# Altium footprint library Metric_SMD.PcbLib: 185 footprints (part 6 of 12)
Each footprint in its own frame and in the unit in brackets; x right, y up, seen from the top. Pads: shape width x height; smd on the part's side, far side on the other; paste and mask are expansions set on the pad; w line width, h text height; cw(c..) or ccw(c..) is an arc to the next point about the centre after c.
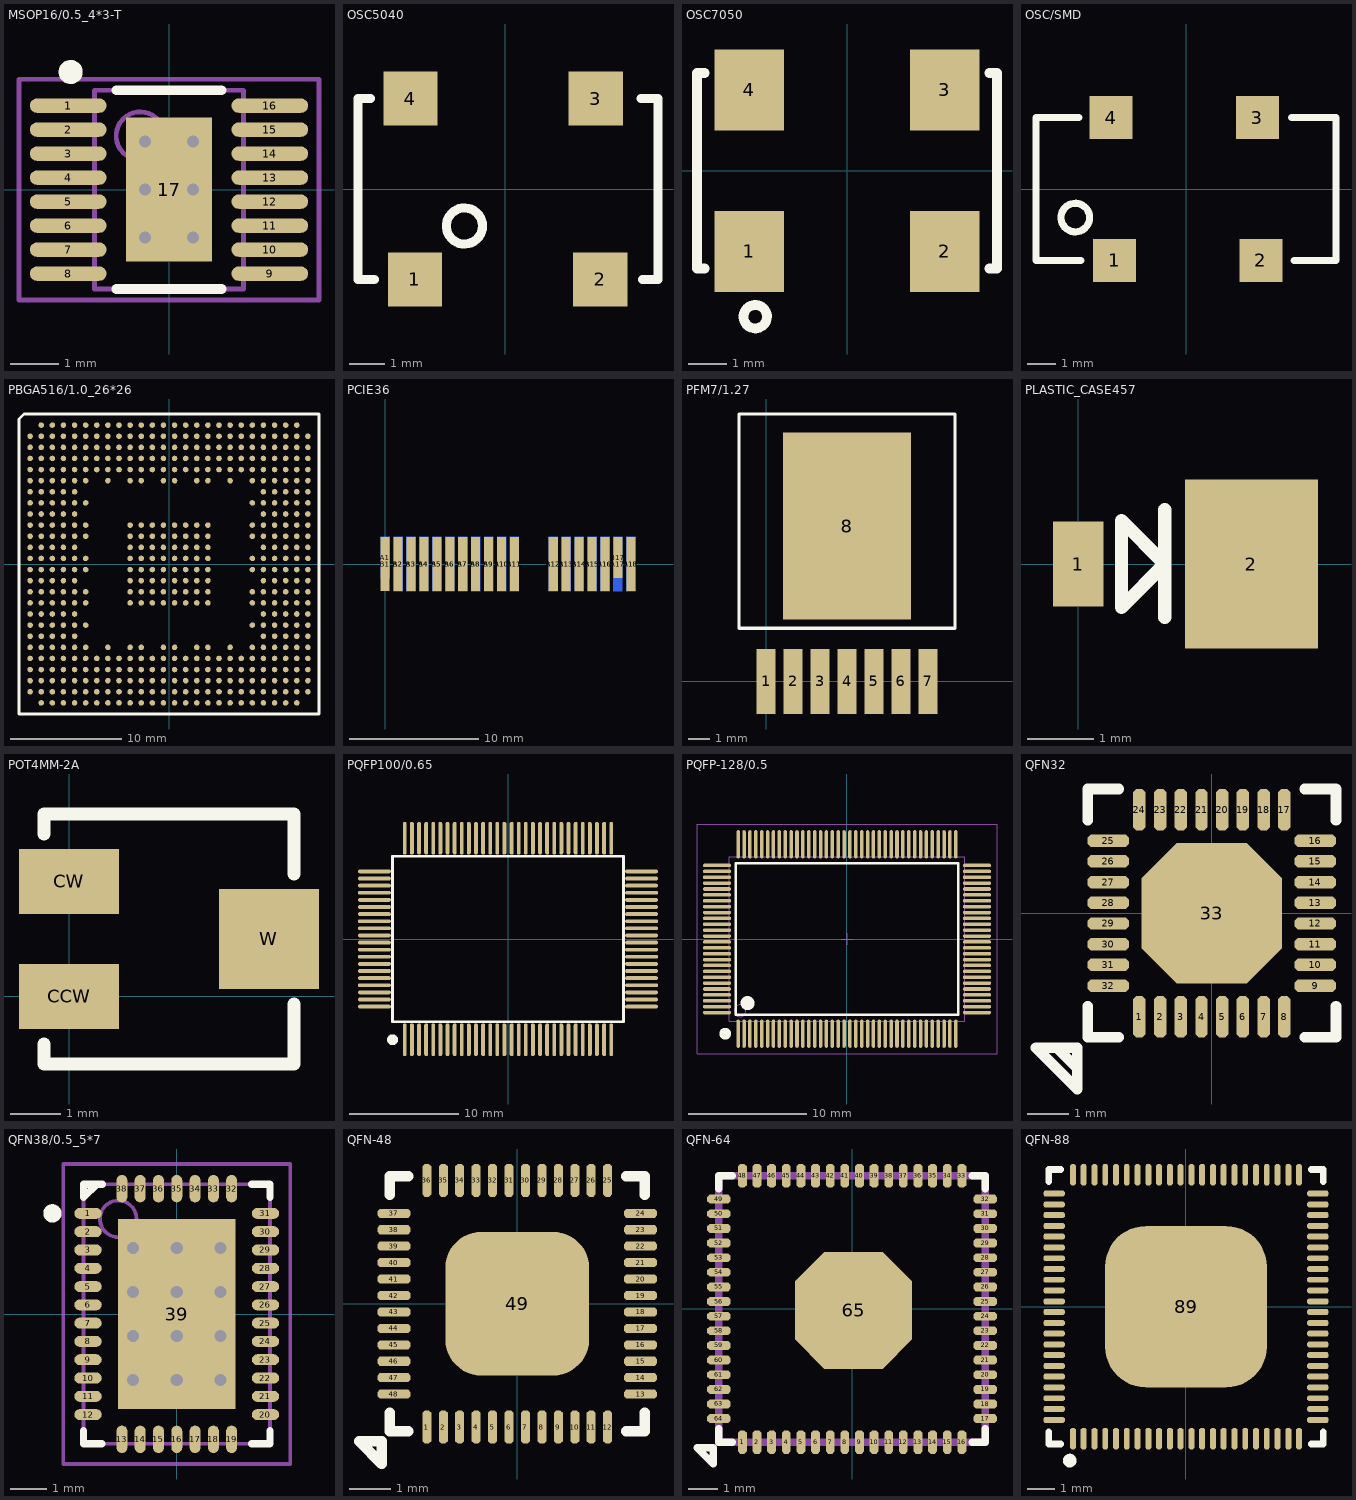
[diagram p5: the footprints below, top view; thin cyan lines are the x and y axes]

## MSOP16/0.5_4*3-T [mm] "MSOP, 16-Leads,  Exposed Die Pad,Body 4.1x3.1mm (max), Pitch 0.50mm, IPC Medium Density"
height 1.1
pads (17):
  oval 1.6x0.3 smd: 1(-2.1,1.75) 2(-2.1,1.25) 3(-2.1,0.75) 4(-2.1,0.25) 5(-2.1,-0.25) 6(-2.1,-0.75) 7(-2.1,-1.25) 8(-2.1,-1.75) 9(2.1,-1.75) 10(2.1,-1.25) 11(2.1,-0.75) 12(2.1,-0.25) 13(2.1,0.25) 14(2.1,0.75) 15(2.1,1.25) 16(2.1,1.75)
  rect 1.8x3 smd: 17(0,0)
via 0.5,-1 diameter 0.559 hole 0.254
via -0.5,-1 diameter 0.559 hole 0.254
via 0.5,0 diameter 0.559 hole 0.254
via -0.5,0 diameter 0.559 hole 0.254
via 0.5,1 diameter 0.559 hole 0.254
via -0.5,1 diameter 0.559 hole 0.254
Top Overlay:
  circle w0.25: c-2.05,2.45 r0.125
  lines w0.2: -1.1,-2.07 1.1,-2.07 ; -1.1,2.07 1.1,2.07
Mechanical 13:
  circle w0.1: c-0.6,1.12 r0.5
  lines w0.1: -1.55,-2.07 1.55,-2.07 1.55,2.07 -1.55,2.07 -1.55,-2.07
Mechanical 15:
  lines w0.1: -0.5,0 0.5,0 ; 0,-0.5 0,0.5 ; -3.125,-2.3 3.125,-2.3 3.125,2.3 -3.125,2.3 -3.125,-2.3
3D body: height 1.1, standoff 0.05, extent -1.55,-2.07 1.55,2.07

## OSC5040 [mil] "晶振SMD 200 x 160mil"
height 60
pads (4):
  rect 60x60 smd: 1(-100,-100) 2(105,-100) 3(100,100) 4(-105,100)
Top Overlay:
  circle w10: c-45.2,-40.94 r20
  lines w10: -149,100 -163,100 -163,-100 -145,-100 ; 150,100 169,100 169,-100 152,-100
3D body: height 78.74, standoff 7.87, extent -151.18,-100 151.97,100.79
3D body: height 86.61, standoff 7.87, extent -119.69,-82.28 112.6,79.13

## OSC7050 [mm] "晶振SMD 7.0x5.0mm"
height 1.524
pads (4):
  rect 1.8x2.1 smd: 1(-2.54,-2.1) 2(2.54,-2.1) 3(2.54,2.1) 4(-2.54,2.1)
Top Overlay:
  lines w0.254: -3.7,-2.54 -3.9,-2.54 -3.9,2.54 -3.7,2.54 ; -2.083,-3.759 ccw(c-2.385,-3.796) -2.081,-3.796 ; 3.7,-2.54 3.9,-2.54 3.9,2.54 3.7,2.54
3D body "User Library-ASV-Oscil.STEP": height 1.8, standoff 0, extent -3.515,-2.6 3.485,2.48

## OSC/SMD [mil]
height 118.11
pads (4):
  rect 60x60 smd: 1(-100,-100) 2(105,-100) 3(100,100) 4(-105,100)
Top Overlay:
  circle w10: c-155,-40 r20
  lines w10: -150,100 -210,100 -210,-100 -147,-100 ; 148,100 210,100 210,-100 151,-100

## PBGA516/1.0_26*26 [mm]
height 2.25
pads (516):
  round 0.5 smd: A2(-11.5,12.5) A3(-10.5,12.5) A4(-9.5,12.5) A5(-8.5,12.5) A6(-7.5,12.5) A7(-6.5,12.5) A8(-5.5,12.5) A9(-4.5,12.5) A10(-3.5,12.5) A11(-2.5,12.5) A12(-1.5,12.5) A13(-0.5,12.5) A14(0.5,12.5) A15(1.5,12.5) A16(2.5,12.5) A17(3.5,12.5) A18(4.5,12.5) A19(5.5,12.5) A20(6.5,12.5) A21(7.5,12.5) A22(8.5,12.5) A23(9.5,12.5) A24(10.5,12.5) A25(11.5,12.5) AA1(-12.5,-7.5) AA2(-11.5,-7.5) AA3(-10.5,-7.5) AA4(-9.5,-7.5) AA5(-8.5,-7.5) AA6(-7.5,-7.5) AA8(-5.5,-7.5) AA10(-3.5,-7.5) AA11(-2.5,-7.5) AA13(-0.5,-7.5) AA14(0.5,-7.5) AA16(2.5,-7.5) AA17(3.5,-7.5) AA19(5.5,-7.5) AA21(7.5,-7.5) AA22(8.5,-7.5) AA23(9.5,-7.5) AA24(10.5,-7.5) AA25(11.5,-7.5) AA26(12.5,-7.5) AB1(-12.5,-8.5) AB2(-11.5,-8.5) AB3(-10.5,-8.5) AB4(-9.5,-8.5) AB5(-8.5,-8.5) AB6(-7.5,-8.5) AB7(-6.5,-8.5) AB8(-5.5,-8.5) AB9(-4.5,-8.5) AB10(-3.5,-8.5) AB11(-2.5,-8.5) AB12(-1.5,-8.5) AB13(-0.5,-8.5) AB14(0.5,-8.5) AB15(1.5,-8.5) AB16(2.5,-8.5) AB17(3.5,-8.5) AB18(4.5,-8.5) AB19(5.5,-8.5) AB20(6.5,-8.5) AB21(7.5,-8.5) AB22(8.5,-8.5) AB23(9.5,-8.5) AB24(10.5,-8.5) AB25(11.5,-8.5) AB26(12.5,-8.5) AC1(-12.5,-9.5) AC2(-11.5,-9.5) AC3(-10.5,-9.5) AC4(-9.5,-9.5) AC5(-8.5,-9.5) AC6(-7.5,-9.5) AC7(-6.5,-9.5) AC8(-5.5,-9.5) AC9(-4.5,-9.5) AC10(-3.5,-9.5) AC11(-2.5,-9.5) AC12(-1.5,-9.5) AC13(-0.5,-9.5) AC14(0.5,-9.5) AC15(1.5,-9.5) AC16(2.5,-9.5) AC17(3.5,-9.5) AC18(4.5,-9.5) AC19(5.5,-9.5) AC20(6.5,-9.5) AC21(7.5,-9.5) AC22(8.5,-9.5) AC23(9.5,-9.5) AC24(10.5,-9.5) AC25(11.5,-9.5) AC26(12.5,-9.5) AD1(-12.5,-10.5) AD2(-11.5,-10.5) AD3(-10.5,-10.5) AD4(-9.5,-10.5) AD5(-8.5,-10.5) AD6(-7.5,-10.5) AD7(-6.5,-10.5) AD8(-5.5,-10.5) AD9(-4.5,-10.5) AD10(-3.5,-10.5) AD11(-2.5,-10.5) AD12(-1.5,-10.5) AD13(-0.5,-10.5) AD14(0.5,-10.5) AD15(1.5,-10.5) AD16(2.5,-10.5) AD17(3.5,-10.5) AD18(4.5,-10.5) AD19(5.5,-10.5) AD20(6.5,-10.5) AD21(7.5,-10.5) AD22(8.5,-10.5) AD23(9.5,-10.5) AD24(10.5,-10.5) AD25(11.5,-10.5) AD26(12.5,-10.5) AE1(-12.5,-11.5) AE2(-11.5,-11.5) AE3(-10.5,-11.5) AE4(-9.5,-11.5) AE5(-8.5,-11.5) AE6(-7.5,-11.5) AE7(-6.5,-11.5) AE8(-5.5,-11.5) AE9(-4.5,-11.5) AE10(-3.5,-11.5) AE11(-2.5,-11.5) AE12(-1.5,-11.5) AE13(-0.5,-11.5) AE14(0.5,-11.5) AE15(1.5,-11.5) AE16(2.5,-11.5) AE17(3.5,-11.5) AE18(4.5,-11.5) AE19(5.5,-11.5) AE20(6.5,-11.5) AE21(7.5,-11.5) AE22(8.5,-11.5) AE23(9.5,-11.5) AE24(10.5,-11.5) AE25(11.5,-11.5) AE26(12.5,-11.5) AF2(-11.5,-12.5) AF3(-10.5,-12.5) AF4(-9.5,-12.5) AF5(-8.5,-12.5) AF6(-7.5,-12.5) AF7(-6.5,-12.5) AF8(-5.5,-12.5) AF9(-4.5,-12.5) AF10(-3.5,-12.5) AF11(-2.5,-12.5) AF12(-1.5,-12.5) AF13(-0.5,-12.5) AF14(0.5,-12.5) AF15(1.5,-12.5) AF16(2.5,-12.5) AF17(3.5,-12.5) AF18(4.5,-12.5) AF19(5.5,-12.5) AF20(6.5,-12.5) AF21(7.5,-12.5) AF22(8.5,-12.5) AF23(9.5,-12.5) AF24(10.5,-12.5) AF25(11.5,-12.5) B1(-12.5,11.5) B2(-11.5,11.5) B3(-10.5,11.5) B4(-9.5,11.5) B5(-8.5,11.5) B6(-7.5,11.5) B7(-6.5,11.5) B8(-5.5,11.5) B9(-4.5,11.5) B10(-3.5,11.5) B11(-2.5,11.5) B12(-1.5,11.5) B13(-0.5,11.5) B14(0.5,11.5) B15(1.5,11.5) B16(2.5,11.5) B17(3.5,11.5) B18(4.5,11.5) B19(5.5,11.5) B20(6.5,11.5) B21(7.5,11.5) B22(8.5,11.5) B23(9.5,11.5) B24(10.5,11.5) B25(11.5,11.5) B26(12.5,11.5) C1(-12.5,10.5) C2(-11.5,10.5) C3(-10.5,10.5) C4(-9.5,10.5) C5(-8.5,10.5) C6(-7.5,10.5) C7(-6.5,10.5) C8(-5.5,10.5) C9(-4.5,10.5) C10(-3.5,10.5) C11(-2.5,10.5) C12(-1.5,10.5) C13(-0.5,10.5) C14(0.5,10.5) C15(1.5,10.5) C16(2.5,10.5) C17(3.5,10.5) C18(4.5,10.5) C19(5.5,10.5) C20(6.5,10.5) C21(7.5,10.5) C22(8.5,10.5) C23(9.5,10.5) C24(10.5,10.5) C25(11.5,10.5) C26(12.5,10.5) D1(-12.5,9.5) D2(-11.5,9.5) D3(-10.5,9.5) D4(-9.5,9.5) D5(-8.5,9.5) D6(-7.5,9.5) D7(-6.5,9.5) D8(-5.5,9.5) D9(-4.5,9.5) D10(-3.5,9.5) D11(-2.5,9.5) D12(-1.5,9.5) D13(-0.5,9.5) D14(0.5,9.5) D15(1.5,9.5) D16(2.5,9.5) D17(3.5,9.5) D18(4.5,9.5) D19(5.5,9.5) D20(6.5,9.5) D21(7.5,9.5) D22(8.5,9.5) D23(9.5,9.5) D24(10.5,9.5) D25(11.5,9.5) D26(12.5,9.5) E1(-12.5,8.5) E2(-11.5,8.5) E3(-10.5,8.5) E4(-9.5,8.5) E5(-8.5,8.5) E6(-7.5,8.5) E7(-6.5,8.5) E8(-5.5,8.5) E9(-4.5,8.5) E10(-3.5,8.5) E11(-2.5,8.5) E12(-1.5,8.5) E13(-0.5,8.5) E14(0.5,8.5) E15(1.5,8.5) E16(2.5,8.5) E17(3.5,8.5) E18(4.5,8.5) E19(5.5,8.5) E20(6.5,8.5) E21(7.5,8.5) E22(8.5,8.5) E23(9.5,8.5) E24(10.5,8.5) E25(11.5,8.5) E26(12.5,8.5) F1(-12.5,7.5) F2(-11.5,7.5) F3(-10.5,7.5) F4(-9.5,7.5) F5(-8.5,7.5) F6(-7.5,7.5) F8(-5.5,7.5) F10(-3.5,7.5) F11(-2.5,7.5) F13(-0.5,7.5) F14(0.5,7.5) F16(2.5,7.5) F17(3.5,7.5) F19(5.5,7.5) F21(7.5,7.5) F22(8.5,7.5) F23(9.5,7.5) F24(10.5,7.5) F25(11.5,7.5) F26(12.5,7.5) G1(-12.5,6.5) G2(-11.5,6.5) G3(-10.5,6.5) G4(-9.5,6.5) G5(-8.5,6.5) G22(8.5,6.5) G23(9.5,6.5) G24(10.5,6.5) G25(11.5,6.5) G26(12.5,6.5) H1(-12.5,5.5) H2(-11.5,5.5) H3(-10.5,5.5) H4(-9.5,5.5) H5(-8.5,5.5) H6(-7.5,5.5) H21(7.5,5.5) H22(8.5,5.5) H23(9.5,5.5) H24(10.5,5.5) H25(11.5,5.5) H26(12.5,5.5) J1(-12.5,4.5) J2(-11.5,4.5) J3(-10.5,4.5) J4(-9.5,4.5) J5(-8.5,4.5) J22(8.5,4.5) J23(9.5,4.5) J24(10.5,4.5) J25(11.5,4.5) J26(12.5,4.5) K1(-12.5,3.5) K2(-11.5,3.5) K3(-10.5,3.5) K4(-9.5,3.5) K5(-8.5,3.5) K6(-7.5,3.5) K10(-3.5,3.5) K11(-2.5,3.5) K12(-1.5,3.5) K13(-0.5,3.5) K14(0.5,3.5) K15(1.5,3.5) K16(2.5,3.5) K17(3.5,3.5) K21(7.5,3.5) K22(8.5,3.5) K23(9.5,3.5) K24(10.5,3.5) K25(11.5,3.5) K26(12.5,3.5) L1(-12.5,2.5) L2(-11.5,2.5) L3(-10.5,2.5) L4(-9.5,2.5) L5(-8.5,2.5) L6(-7.5,2.5) L10(-3.5,2.5) L11(-2.5,2.5) L12(-1.5,2.5) L13(-0.5,2.5) L14(0.5,2.5) L15(1.5,2.5) L16(2.5,2.5) L17(3.5,2.5) L21(7.5,2.5) L22(8.5,2.5) L23(9.5,2.5) L24(10.5,2.5) L25(11.5,2.5) L26(12.5,2.5) M1(-12.5,1.5) M2(-11.5,1.5) M3(-10.5,1.5) M4(-9.5,1.5) M5(-8.5,1.5) M10(-3.5,1.5) M11(-2.5,1.5) M12(-1.5,1.5) M13(-0.5,1.5) M14(0.5,1.5) M15(1.5,1.5) M16(2.5,1.5) M17(3.5,1.5) M22(8.5,1.5) M23(9.5,1.5) M24(10.5,1.5) M25(11.5,1.5) M26(12.5,1.5) N1(-12.5,0.5) N2(-11.5,0.5) N3(-10.5,0.5) N4(-9.5,0.5) N5(-8.5,0.5) N6(-7.5,0.5) N10(-3.5,0.5) N11(-2.5,0.5) N12(-1.5,0.5) N13(-0.5,0.5) N14(0.5,0.5) N15(1.5,0.5) N16(2.5,0.5) N17(3.5,0.5) N21(7.5,0.5) N22(8.5,0.5) N23(9.5,0.5) N24(10.5,0.5) N25(11.5,0.5) N26(12.5,0.5) P1(-12.5,-0.5) P2(-11.5,-0.5) P3(-10.5,-0.5) P4(-9.5,-0.5) P5(-8.5,-0.5) P6(-7.5,-0.5) P10(-3.5,-0.5) P11(-2.5,-0.5) P12(-1.5,-0.5) P13(-0.5,-0.5) P14(0.5,-0.5) P15(1.5,-0.5) P16(2.5,-0.5) P17(3.5,-0.5) P21(7.5,-0.5) P22(8.5,-0.5) P23(9.5,-0.5) P24(10.5,-0.5) P25(11.5,-0.5) P26(12.5,-0.5) R1(-12.5,-1.5) R2(-11.5,-1.5) R3(-10.5,-1.5) R4(-9.5,-1.5) R5(-8.5,-1.5) R10(-3.5,-1.5) R11(-2.5,-1.5) R12(-1.5,-1.5) R13(-0.5,-1.5) R14(0.5,-1.5) R15(1.5,-1.5) R16(2.5,-1.5) R17(3.5,-1.5) R22(8.5,-1.5) R23(9.5,-1.5) R24(10.5,-1.5) R25(11.5,-1.5) R26(12.5,-1.5) T1(-12.5,-2.5) T2(-11.5,-2.5) T3(-10.5,-2.5) T4(-9.5,-2.5) T5(-8.5,-2.5) T6(-7.5,-2.5) T10(-3.5,-2.5) T11(-2.5,-2.5) T12(-1.5,-2.5) T13(-0.5,-2.5) T14(0.5,-2.5) T15(1.5,-2.5) T16(2.5,-2.5) T17(3.5,-2.5) T21(7.5,-2.5) T22(8.5,-2.5) T23(9.5,-2.5) T24(10.5,-2.5) T25(11.5,-2.5) T26(12.5,-2.5) U1(-12.5,-3.5) U2(-11.5,-3.5) U3(-10.5,-3.5) U4(-9.5,-3.5) U5(-8.5,-3.5) U6(-7.5,-3.5) U10(-3.5,-3.5) U11(-2.5,-3.5) U12(-1.5,-3.5) U13(-0.5,-3.5) U14(0.5,-3.5) U15(1.5,-3.5) U16(2.5,-3.5) U17(3.5,-3.5) U21(7.5,-3.5) U22(8.5,-3.5) U23(9.5,-3.5) U24(10.5,-3.5) U25(11.5,-3.5) U26(12.5,-3.5) V1(-12.5,-4.5) V2(-11.5,-4.5) V3(-10.5,-4.5) V4(-9.5,-4.5) V5(-8.5,-4.5) V22(8.5,-4.5) V23(9.5,-4.5) V24(10.5,-4.5) V25(11.5,-4.5) V26(12.5,-4.5) W1(-12.5,-5.5) W2(-11.5,-5.5) W3(-10.5,-5.5) W4(-9.5,-5.5) W5(-8.5,-5.5) W6(-7.5,-5.5) W21(7.5,-5.5) W22(8.5,-5.5) W23(9.5,-5.5) W24(10.5,-5.5) W25(11.5,-5.5) W26(12.5,-5.5) Y1(-12.5,-6.5) Y2(-11.5,-6.5) Y3(-10.5,-6.5) Y4(-9.5,-6.5) Y5(-8.5,-6.5) Y22(8.5,-6.5) Y23(9.5,-6.5) Y24(10.5,-6.5) Y25(11.5,-6.5) Y26(12.5,-6.5)
Top Overlay:
  lines w0.254: -13.5,-13.5 13.5,-13.5 13.5,13.5 -13.05,13.5 -13.5,13.05 -13.5,-13.5

## PCIE36 [mm] "PCIe1X金手指插头"
pads (36):
  rect 0.7x3.2 smd far side: A1(0,0.5)
  rect 0.7x4.2 smd far side: A2(1,0) A3(2,0) A4(3,0) A5(4,0) A6(5,0) A7(6,0) A8(7,0) A9(8,0) A10(9,0) A11(10,0) A12(13,0) A13(14,0) A14(15,0) A15(16,0) A16(17,0) A17(18,0) A18(19,0)
  rect 0.7x4.2 smd: B1(0,0) B2(1,0) B3(2,0) B4(3,0) B5(4,0) B6(5,0) B7(6,0) B8(7,0) B9(8,0) B10(9,0) B11(10,0) B12(13,0) B13(14,0) B14(15,0) B15(16,0) B16(17,0) B18(19,0)
  rect 0.7x3.2 smd: B17(18,0.5)

## PFM7/1.27 [mm] "7-Lead"
height 4.67
pads (8):
  rect 0.9x3.06 smd: 1(0,0) 2(1.27,0) 3(2.54,0) 4(3.81,0) 5(5.08,0) 6(6.35,0) 7(7.62,0)
  rect 6x8.8 smd: 8(3.81,7.305)
Top Overlay:
  lines w0.152: -1.27,2.505 -1.27,12.585 8.89,12.585 8.89,2.505 -1.27,2.505
3D body: height 2.4, standoff 0, extent -1.27,2.51 8.89,12.585
3D body: height 1.27, standoff 0.89, extent 7.392,0.5 7.9,2.492
3D body: height 1.27, standoff 0, extent 7.392,0.322 7.9,0.83
3D body: height 1.27, standoff 0, extent 6.092,0.322 6.6,0.83
3D body: height 1.27, standoff 0.89, extent 6.092,0.5 6.6,2.492
3D body: height 1.27, standoff 0, extent 0.992,0.222 1.5,0.73
3D body: height 1.27, standoff 0.89, extent 0.992,0.4 1.5,2.392
3D body: height 1.27, standoff 0, extent -0.308,0.322 0.2,0.83
3D body: height 1.27, standoff 0.89, extent -0.308,0.5 0.2,2.492
3D body: height 1.27, standoff 0, extent 3.592,0.322 4.1,0.83
3D body: height 1.27, standoff 0.89, extent 3.592,0.5 4.1,2.492
3D body: height 1.27, standoff 0.89, extent 4.792,0.5 5.3,2.492
3D body: height 1.27, standoff 0, extent 4.792,0.322 5.3,0.83
3D body: height 1.27, standoff 0.89, extent 2.292,0.5 2.8,2.492
3D body: height 1.27, standoff 0, extent 2.292,0.322 2.8,0.83

## PLASTIC_CASE457 [mm] "典型MBRM140T3封装"
height 1
pads (2):
  rect 0.762x1.27 smd: 1(0,0)
  rect 2x2.54 smd: 2(2.6,0)
Top Overlay:
  lines w0.2: 1.3,-0.8 1.3,0.813 ; 0.65,-0.65 0.65,0.65 1.3,0 0.65,-0.65
3D body: height 1, standoff 0.01, extent 0.5,-0.9 2.6,1

## POT4MM-2A [mm] "表贴4mm电位器"
height 3
pads (3):
  rect 2x1.3 smd: CCW(0,0) CW(0,2.3)
  rect 2x2 smd: W(4,1.15)
Top Overlay:
  lines w0.254: -0.5,-0.95 -0.5,-1.35 4.5,-1.35 4.5,-0.15 ; -0.5,3.25 -0.5,3.65 4.5,3.65 4.5,2.45

## PQFP100/0.65 [mm] "pitch=0.65mm"
height 2
pads (100):
  oval 0.35x3 smd: 1(-9.425,-9.2) 2(-8.775,-9.2) 3(-8.125,-9.2) 4(-7.475,-9.2) 5(-6.825,-9.2) 6(-6.175,-9.2) 7(-5.525,-9.2) 8(-4.875,-9.2) 9(-4.225,-9.2) 10(-3.575,-9.2) 11(-2.925,-9.2) 12(-2.275,-9.2) 13(-1.625,-9.2) 14(-0.975,-9.2) 15(-0.325,-9.2) 16(0.325,-9.2) 17(0.975,-9.2) 18(1.625,-9.2) 19(2.275,-9.2) 20(2.925,-9.2) 21(3.575,-9.2) 22(4.225,-9.2) 23(4.875,-9.2) 24(5.525,-9.2) 25(6.175,-9.2) 26(6.825,-9.2) 27(7.475,-9.2) 28(8.125,-9.2) 29(8.775,-9.2) 30(9.425,-9.2) 51(9.425,9.2) 52(8.775,9.2) 53(8.125,9.2) 54(7.475,9.2) 55(6.825,9.2) 56(6.175,9.2) 57(5.525,9.2) 58(4.875,9.2) 59(4.225,9.2) 60(3.575,9.2) 61(2.925,9.2) 62(2.275,9.2) 63(1.625,9.2) 64(0.975,9.2) 65(0.325,9.2) 66(-0.325,9.2) 67(-0.975,9.2) 68(-1.625,9.2) 69(-2.275,9.2) 70(-2.925,9.2) 71(-3.575,9.2) 72(-4.225,9.2) 73(-4.875,9.2) 74(-5.525,9.2) 75(-6.175,9.2) 76(-6.825,9.2) 77(-7.475,9.2) 78(-8.125,9.2) 79(-8.775,9.2) 80(-9.425,9.2)
  oval 3x0.35 smd: 31(12.2,-6.175) 32(12.2,-5.525) 33(12.2,-4.875) 34(12.2,-4.225) 35(12.2,-3.575) 36(12.2,-2.925) 37(12.2,-2.275) 38(12.2,-1.625) 39(12.2,-0.975) 40(12.2,-0.325) 41(12.2,0.325) 42(12.2,0.975) 43(12.2,1.625) 44(12.2,2.275) 45(12.2,2.925) 46(12.2,3.575) 47(12.2,4.225) 48(12.2,4.875) 49(12.2,5.525) 50(12.2,6.175) 81(-12.2,6.175) 82(-12.2,5.525) 83(-12.2,4.875) 84(-12.2,4.225) 85(-12.2,3.575) 86(-12.2,2.925) 87(-12.2,2.275) 88(-12.2,1.625) 89(-12.2,0.975) 90(-12.2,0.325) 91(-12.2,-0.325) 92(-12.2,-0.975) 93(-12.2,-1.625) 94(-12.2,-2.275) 95(-12.2,-2.925) 96(-12.2,-3.575) 97(-12.2,-4.225) 98(-12.2,-4.875) 99(-12.2,-5.525) 100(-12.2,-6.175)
Top Overlay:
  circle w0.5: c-10.55,-9.2 r0.25
  lines w0.254: -10.55,-7.55 10.55,-7.55 10.55,7.55 -10.55,7.55 -10.55,-7.55
3D body: height 1.5, standoff 0, extent -11.1,-8 11.1,8

## PQFP-128/0.5 [mm] "长方128脚0.5mm间距23*14mm"
height 2
pads (128):
  oval 0.3x2.4 smd: 1(-9.25,-8.05) 2(-8.75,-8.05) 3(-8.25,-8.05) 4(-7.75,-8.05) 5(-7.25,-8.05) 6(-6.75,-8.05) 7(-6.25,-8.05) 8(-5.75,-8.05) 9(-5.25,-8.05) 10(-4.75,-8.05) 11(-4.25,-8.05) 12(-3.75,-8.05) 13(-3.25,-8.05) 14(-2.75,-8.05) 15(-2.25,-8.05) 16(-1.75,-8.05) 17(-1.25,-8.05) 18(-0.75,-8.05) 19(-0.25,-8.05) 20(0.25,-8.05) 21(0.75,-8.05) 22(1.25,-8.05) 23(1.75,-8.05) 24(2.25,-8.05) 25(2.75,-8.05) 26(3.25,-8.05) 27(3.75,-8.05) 28(4.25,-8.05) 29(4.75,-8.05) 30(5.25,-8.05) 31(5.75,-8.05) 32(6.25,-8.05) 33(6.75,-8.05) 34(7.25,-8.05) 35(7.75,-8.05) 36(8.25,-8.05) 37(8.75,-8.05) 38(9.25,-8.05) 65(9.25,8.05) 66(8.75,8.05) 67(8.25,8.05) 68(7.75,8.05) 69(7.25,8.05) 70(6.75,8.05) 71(6.25,8.05) 72(5.75,8.05) 73(5.25,8.05) 74(4.75,8.05) 75(4.25,8.05) 76(3.75,8.05) 77(3.25,8.05) 78(2.75,8.05) 79(2.25,8.05) 80(1.75,8.05) 81(1.25,8.05) 82(0.75,8.05) 83(0.25,8.05) 84(-0.25,8.05) 85(-0.75,8.05) 86(-1.25,8.05) 87(-1.75,8.05) 88(-2.25,8.05) 89(-2.75,8.05) 90(-3.25,8.05) 91(-3.75,8.05) 92(-4.25,8.05) 93(-4.75,8.05) 94(-5.25,8.05) 95(-5.75,8.05) 96(-6.25,8.05) 97(-6.75,8.05) 98(-7.25,8.05) 99(-7.75,8.05) 100(-8.25,8.05) 101(-8.75,8.05) 102(-9.25,8.05)
  oval 2.4x0.3 smd: 39(11.05,-6.25) 40(11.05,-5.75) 41(11.05,-5.25) 42(11.05,-4.75) 43(11.05,-4.25) 44(11.05,-3.75) 45(11.05,-3.25) 46(11.05,-2.75) 47(11.05,-2.25) 48(11.05,-1.75) 49(11.05,-1.25) 50(11.05,-0.75) 51(11.05,-0.25) 52(11.05,0.25) 53(11.05,0.75) 54(11.05,1.25) 55(11.05,1.75) 56(11.05,2.25) 57(11.05,2.75) 58(11.05,3.25) 59(11.05,3.75) 60(11.05,4.25) 61(11.05,4.75) 62(11.05,5.25) 63(11.05,5.75) 64(11.05,6.25) 103(-11.05,6.25) 104(-11.05,5.75) 105(-11.05,5.25) 106(-11.05,4.75) 107(-11.05,4.25) 108(-11.05,3.75) 109(-11.05,3.25) 110(-11.05,2.75) 111(-11.05,2.25) 112(-11.05,1.75) 113(-11.05,1.25) 114(-11.05,0.75) 115(-11.05,0.25) 116(-11.05,-0.25) 117(-11.05,-0.75) 118(-11.05,-1.25) 119(-11.05,-1.75) 120(-11.05,-2.25) 121(-11.05,-2.75) 122(-11.05,-3.25) 123(-11.05,-3.75) 124(-11.05,-4.25) 125(-11.05,-4.75) 126(-11.05,-5.25) 127(-11.05,-5.75) 128(-11.05,-6.25)
Top Overlay:
  circle w0.6: c-8.45,-5.45 r0.3
  circle w0.5: c-10.35,-8.05 r0.25
  lines w0.2: -9.45,-6.45 -9.45,6.45 9.45,6.45 9.45,-6.45 -9.45,-6.45
Mechanical 13:
  circle w0.1: c-9.1,-6.1 r0.5
  lines w0.1: -10,-7 -10,7 10,7 10,-7 -10,-7
Mechanical 15:
  lines w0.1: -0.5,0 0.5,0 ; 0,-0.5 0,0.5 ; -12.75,-9.75 -12.75,9.75 12.75,9.75 12.75,-9.75 -12.75,-9.75
3D body: height 1.5, standoff 0, extent -10,-7 10,7

## QFN32 [mm] "0.5mm间距"
height 1.5
pads (33):
  oct 0.3x1 smd: 1(-1.75,-2.5) 2(-1.25,-2.5) 3(-0.75,-2.5) 4(-0.25,-2.5) 5(0.25,-2.5) 6(0.75,-2.5) 7(1.25,-2.5) 8(1.75,-2.5) 17(1.75,2.5) 18(1.25,2.5) 19(0.75,2.5) 20(0.25,2.5) 21(-0.25,2.5) 22(-0.75,2.5) 23(-1.25,2.5) 24(-1.75,2.5)
  oct 1x0.3 smd: 9(2.5,-1.75) 10(2.5,-1.25) 11(2.5,-0.75) 12(2.5,-0.25) 13(2.5,0.25) 14(2.5,0.75) 15(2.5,1.25) 16(2.5,1.75) 25(-2.5,1.75) 26(-2.5,1.25) 27(-2.5,0.75) 28(-2.5,0.25) 29(-2.5,-0.25) 30(-2.5,-0.75) 31(-2.5,-1.25) 32(-2.5,-1.75)
  oct 3.4x3.4 smd: 33(0,0)
Top Overlay:
  lines w0.254: -3.75,-3.25 -3.25,-3.75 ; -3,-2.25 -3,-3 -2.25,-3 ; -3,2.25 -3,3 -2.25,3 ; 2.25,-3 3,-3 3,-2.25 ; 2.25,3 3,3 3,2.25 ; -4.25,-3.25 -3.25,-3.25 -3.25,-4.25 -4.25,-3.25

## QFN38/0.5_5*7 [mm] "QFN, 38-Leads, Body 7.1x5.1mm (max), Pitch 0.50mm, IPC Medium Density"
height 0.8
pads (39):
  oval 0.75x0.3 smd: 1(-2.425,2.75) 2(-2.425,2.25) 3(-2.425,1.75) 4(-2.425,1.25) 5(-2.425,0.75) 6(-2.425,0.25) 7(-2.425,-0.25) 8(-2.425,-0.75) 9(-2.425,-1.25) 10(-2.425,-1.75) 11(-2.425,-2.25) 12(-2.425,-2.75) 20(2.425,-2.75) 21(2.425,-2.25) 22(2.425,-1.75) 23(2.425,-1.25) 24(2.425,-0.75) 25(2.425,-0.25) 26(2.425,0.25) 27(2.425,0.75) 28(2.425,1.25) 29(2.425,1.75) 30(2.425,2.25) 31(2.425,2.75)
  oval 0.3x0.75 smd: 13(-1.5,-3.425) 14(-1,-3.425) 15(-0.5,-3.425) 16(0,-3.425) 17(0.5,-3.425) 18(1,-3.425) 19(1.5,-3.425) 32(1.5,3.425) 33(1,3.425) 34(0.5,3.425) 35(0,3.425) 36(-0.5,3.425) 37(-1,3.425) 38(-1.5,3.425)
  rect 3.2x5.2 smd: 39(0,0)
via 1.2,-1.8 diameter 0.66 hole 0.33
via 0,-1.8 diameter 0.66 hole 0.33
via -1.2,-1.8 diameter 0.66 hole 0.33
via 1.2,-0.6 diameter 0.66 hole 0.33
via 0,-0.6 diameter 0.66 hole 0.33
via -1.2,-0.6 diameter 0.66 hole 0.33
via 1.2,0.6 diameter 0.66 hole 0.33
via 0,0.6 diameter 0.66 hole 0.33
via -1.2,0.6 diameter 0.66 hole 0.33
via 1.2,1.8 diameter 0.66 hole 0.33
via 0,1.8 diameter 0.66 hole 0.33
via -1.2,1.8 diameter 0.66 hole 0.33
Top Overlay:
  circle w0.25: c-3.4,2.75 r0.125
  lines w0.2: -2.55,-3.185 -2.55,-3.55 -2.05,-3.55 ; 2.05,-3.55 2.55,-3.55 2.55,-3.185 ; 2.05,3.55 2.55,3.55 2.55,3.185 ; -2.55,3.185 -2.55,3.55 -2.032,3.55 -2.185,3.55 -2.55,3.185
Mechanical 13:
  circle w0.1: c-1.6,2.6 r0.5
  lines w0.1: -2.55,-3.55 2.55,-3.55 2.55,3.55 -2.55,3.55 -2.55,-3.55
Mechanical 15:
  lines w0.1: -0.5,0 0.5,0 ; 0,-0.5 0,0.5 ; -3.1,-4.1 3.1,-4.1 3.1,4.1 -3.1,4.1 -3.1,-4.1
3D body: height 0.8, standoff 0, extent -2.55,-3.55 2.55,3.55

## QFN-48 [mm] "0.4mm间距"
height 1.5
pads (49):
  oct 0.22x0.8 smd: 1(-2.2,-3) 2(-1.8,-3) 3(-1.4,-3) 4(-1,-3) 5(-0.6,-3) 6(-0.2,-3) 7(0.2,-3) 8(0.6,-3) 9(1,-3) 10(1.4,-3) 11(1.8,-3) 12(2.2,-3) 25(2.2,3) 26(1.8,3) 27(1.4,3) 28(1,3) 29(0.6,3) 30(0.2,3) 31(-0.2,3) 32(-0.6,3) 33(-1,3) 34(-1.4,3) 35(-1.8,3) 36(-2.2,3)
  oct 0.8x0.22 smd: 13(3,-2.2) 14(3,-1.8) 15(3,-1.4) 16(3,-1) 17(3,-0.6) 18(3,-0.2) 19(3,0.2) 20(3,0.6) 21(3,1) 22(3,1.4) 23(3,1.8) 24(3,2.2) 37(-3,2.2) 38(-3,1.8) 39(-3,1.4) 40(-3,1) 41(-3,0.6) 42(-3,0.2) 43(-3,-0.2) 44(-3,-0.6) 45(-3,-1) 46(-3,-1.4) 47(-3,-1.8) 48(-3,-2.2)
  rrect50% 3.5x3.5 smd: 49(0,0)
Top Overlay:
  lines w0.254: -3.1,-2.65 -3.1,-3.1 -2.65,-3.1 ; -3.1,2.65 -3.1,3.1 -2.65,3.1 ; 2.65,-3.1 3.1,-3.1 3.1,-2.65 ; 2.65,3.1 3.1,3.1 3.1,2.65 ; -3.85,-3.35 -3.3,-3.35 -3.3,-3.9 -3.85,-3.35
3D body: height 0.8, standoff 0.1, extent -2.7,-2.7 2.7,2.8

## QFN-64 [mm] "0.5mm间距"
height 1.5
pads (65):
  oct 0.3x0.8 smd: 1(-3.75,-4.55) 2(-3.25,-4.55) 3(-2.75,-4.55) 4(-2.25,-4.55) 5(-1.75,-4.55) 6(-1.25,-4.55) 7(-0.75,-4.55) 8(-0.25,-4.55) 9(0.25,-4.55) 10(0.75,-4.55) 11(1.25,-4.55) 12(1.75,-4.55) 13(2.25,-4.55) 14(2.75,-4.55) 15(3.25,-4.55) 16(3.75,-4.55) 33(3.75,4.55) 34(3.25,4.55) 35(2.75,4.55) 36(2.25,4.55) 37(1.75,4.55) 38(1.25,4.55) 39(0.75,4.55) 40(0.25,4.55) 41(-0.25,4.55) 42(-0.75,4.55) 43(-1.25,4.55) 44(-1.75,4.55) 45(-2.25,4.55) 46(-2.75,4.55) 47(-3.25,4.55) 48(-3.75,4.55)
  oct 0.8x0.3 smd: 17(4.55,-3.75) 18(4.55,-3.25) 19(4.55,-2.75) 20(4.55,-2.25) 21(4.55,-1.75) 22(4.55,-1.25) 23(4.55,-0.75) 24(4.55,-0.25) 25(4.55,0.25) 26(4.55,0.75) 27(4.55,1.25) 28(4.55,1.75) 29(4.55,2.25) 30(4.55,2.75) 31(4.55,3.25) 32(4.55,3.75) 49(-4.55,3.75) 50(-4.55,3.25) 51(-4.55,2.75) 52(-4.55,2.25) 53(-4.55,1.75) 54(-4.55,1.25) 55(-4.55,0.75) 56(-4.55,0.25) 57(-4.55,-0.25) 58(-4.55,-0.75) 59(-4.55,-1.25) 60(-4.55,-1.75) 61(-4.55,-2.25) 62(-4.55,-2.75) 63(-4.55,-3.25) 64(-4.55,-3.75)
  oct 4x4 smd: 65(0.05,-0.05)
Top Overlay:
  lines w0.254: -4.55,-4.1 -4.55,-4.55 -4.1,-4.55 ; -4.55,4.1 -4.55,4.55 -4.1,4.55 ; 4.1,-4.55 4.55,-4.55 4.55,-4.1 ; 4.1,4.55 4.55,4.55 4.55,4.1 ; -5.3,-4.75 -4.75,-5.3 -4.75,-4.75 -5.3,-4.75
Mechanical 1:
  lines w0.254: -4.55,-4.55 -4.55,4.55 4.55,4.55 4.55,-4.55 -4.55,-4.55
3D body: height 0.8, standoff 0.1, extent -4.25,-4.15 4.15,4.25

## QFN-88 [mm] "0.4mm间距"
height 1.5
pads (89):
  oct 0.22x0.8 smd: 1(-4.2,-4.9) 2(-3.8,-4.9) 3(-3.4,-4.9) 4(-3,-4.9) 5(-2.6,-4.9) 6(-2.2,-4.9) 7(-1.8,-4.9) 8(-1.4,-4.9) 9(-1,-4.9) 10(-0.6,-4.9) 11(-0.2,-4.9) 12(0.2,-4.9) 13(0.6,-4.9) 14(1,-4.9) 15(1.4,-4.9) 16(1.8,-4.9) 17(2.2,-4.9) 18(2.6,-4.9) 19(3,-4.9) 20(3.4,-4.9) 21(3.8,-4.9) 22(4.2,-4.9) 45(4.2,4.9) 46(3.8,4.9) 47(3.4,4.9) 48(3,4.9) 49(2.6,4.9) 50(2.2,4.9) 51(1.8,4.9) 52(1.4,4.9) 53(1,4.9) 54(0.6,4.9) 55(0.2,4.9) 56(-0.2,4.9) 57(-0.6,4.9) 58(-1,4.9) 59(-1.4,4.9) 60(-1.8,4.9) 61(-2.2,4.9) 62(-2.6,4.9) 63(-3,4.9) 64(-3.4,4.9) 65(-3.8,4.9) 66(-4.2,4.9)
  oct 0.8x0.22 smd: 23(4.9,-4.2) 24(4.9,-3.8) 25(4.9,-3.4) 26(4.9,-3) 27(4.9,-2.6) 28(4.9,-2.2) 29(4.9,-1.8) 30(4.9,-1.4) 31(4.9,-1) 32(4.9,-0.6) 33(4.9,-0.2) 34(4.9,0.2) 35(4.9,0.6) 36(4.9,1) 37(4.9,1.4) 38(4.9,1.8) 39(4.9,2.2) 40(4.9,2.6) 41(4.9,3) 42(4.9,3.4) 43(4.9,3.8) 44(4.9,4.2) 67(-4.9,4.2) 68(-4.9,3.8) 69(-4.9,3.4) 70(-4.9,3) 71(-4.9,2.6) 72(-4.9,2.2) 73(-4.9,1.8) 74(-4.9,1.4) 75(-4.9,1) 76(-4.9,0.6) 77(-4.9,0.2) 78(-4.9,-0.2) 79(-4.9,-0.6) 80(-4.9,-1) 81(-4.9,-1.4) 82(-4.9,-1.8) 83(-4.9,-2.2) 84(-4.9,-2.6) 85(-4.9,-3) 86(-4.9,-3.4) 87(-4.9,-3.8) 88(-4.9,-4.2)
  rrect50% 6x6 smd: 89(0,0)
Top Overlay:
  circle w0.254: c-4.318,-5.715 r0.127
  lines w0.254: -5.1,-4.65 -5.1,-5.1 -4.65,-5.1 ; -5.1,4.65 -5.1,5.1 -4.65,5.1 ; 4.65,-5.1 5.1,-5.1 5.1,-4.65 ; 4.65,5.1 5.1,5.1 5.1,4.65
3D body: height 1.2, standoff 0.2, extent -4.8,-4.7 4.8,4.8